# Altium footprint library pcb.PcbLib: 397 footprints (part 6 of 25)
Each footprint in its own frame and in the unit in brackets; x right, y up, seen from the top. Pads: shape width x height; smd on the part's side, far side on the other; paste and mask are expansions set on the pad; w line width, h text height; cw(c..) or ccw(c..) is an arc to the next point about the centre after c.
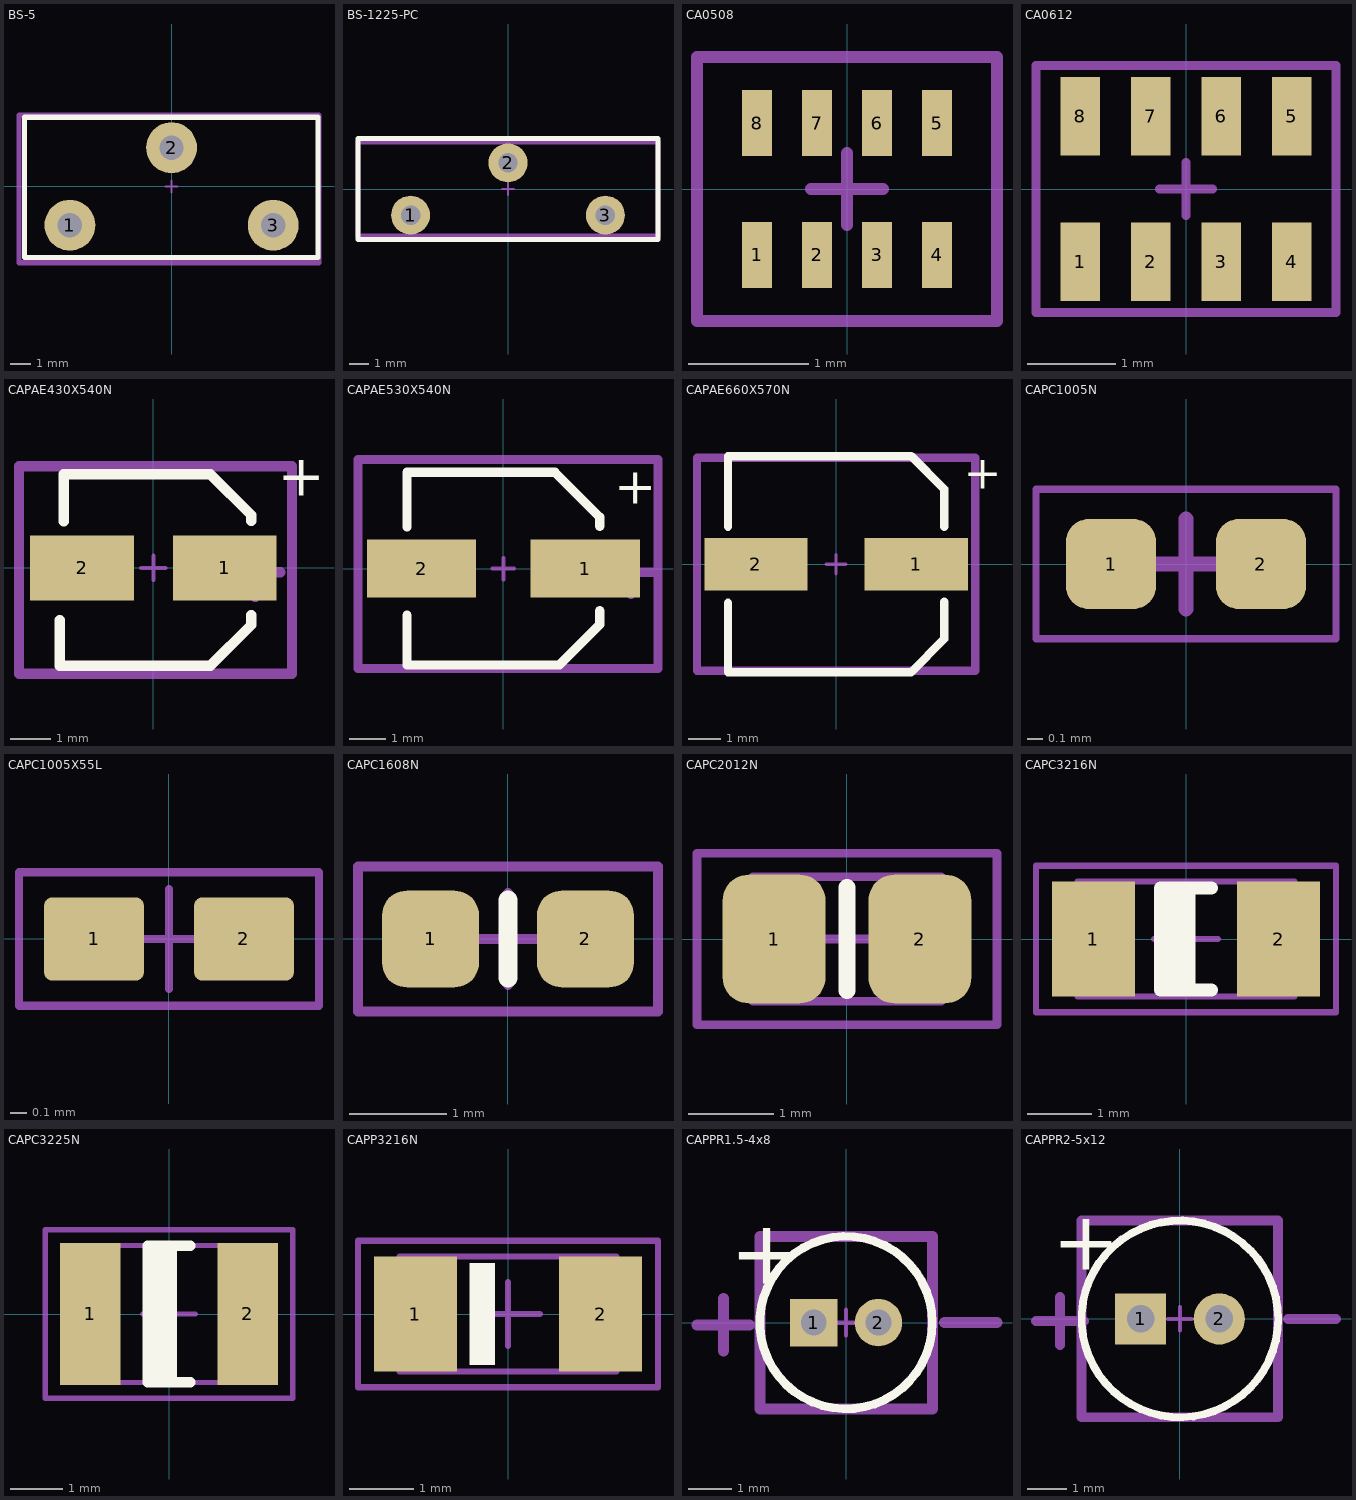
[diagram p5: the footprints below, top view; thin cyan lines are the x and y axes]

## BS-5 [mm] "Holder, Coin Cell CR2032"
height 6.75
pads (3):
  round 2.5 hole 1.2: 1(-5,-1.905) 2(0,1.905) 3(5,-1.905)
Top Overlay:
  lines w0.254: -7.224,-3.5 7.2,-3.5 7.2,3.4 -7.224,3.4 -7.224,-3.5
Mechanical 15:
  lines w0.1: -0.3,0 0.3,0 ; 0,-0.3 0,0.3
  lines w0.254: -7.5,-3.75 -7.5,3.5 7.25,3.5 7.25,-3.75 -7.5,-3.75
  text ".Designator" at -4.5,-0.5 h1.02
3D body: height 24.48, standoff 1.52, extent -11.555,-3 11.355,2.8
3D body: height 5, standoff 0, extent -7,-3 7,2.8

## BS-1225-PC [mm] "Holder, Coin Cell CR1220"
height 6.75
pads (3):
  round 2 hole 1: 1(-5,-1.345) 2(0,1.345) 3(5,-1.345)
Top Overlay:
  lines w0.254: -7.7,-2.6 7.7,-2.6 7.7,2.6 -7.7,2.6 -7.7,-2.6
Mechanical 15:
  lines w0.1: -0.3,0 0.3,0 ; 0,-0.3 0,0.3
  lines w0.254: -7.7,-2.4 -7.7,2.4 7.7,2.4 7.7,-2.4 -7.7,-2.4
  text ".Designator" at -4.5,-0.5 h1.02
3D body "BS-1225-PC.STEP": height 14.02, standoff -2.79, extent -7.637,-2.3 7.637,2.33
3D body: height 14.24, standoff 1.76, extent -6.025,-1.9 6.425,1.6

## CA0508 [mm]
height 1
pads (8):
  rect 0.25x0.55 smd paste-0.03: 1(-0.75,-0.55) 2(-0.25,-0.55) 3(0.25,-0.55) 4(0.75,-0.55) 5(0.75,0.55) 6(0.25,0.55) 7(-0.25,0.55) 8(-0.75,0.55)
Mechanical 15:
  lines w0.1: -0.3,0 0.3,0 ; 0,-0.3 0,0.3 ; -1.25,-1.1 1.25,-1.1 1.25,1.1 -1.25,1.1 -1.25,-1.1
  text ".Designator" at -0.9,-0.8 h0.51
3D body: height 0.45, standoff 0, extent -1,-0.625 1,0.625

## CA0612 [mm]
height 1
pads (8):
  rect 0.45x0.89 smd paste-0.03: 1(-1.2,-0.825) 2(-0.4,-0.825) 3(0.4,-0.825) 4(1.2,-0.825) 5(1.2,0.825) 6(0.4,0.825) 7(-0.4,0.825) 8(-1.2,0.825)
Mechanical 15:
  lines w0.1: -0.3,0 0.3,0 ; 0,-0.3 0,0.3 ; -1.7,-1.4 -1.7,1.4 1.7,1.4 1.7,-1.4 -1.7,-1.4
  text ".Designator" at -1.5,-1.2 h0.51
3D body: height 0.45, standoff 0, extent -1.6,-0.8 1.6,0.8

## CAPAE430X540N [mm] "Capacitor,Aluminum Electrolytic;4.30mm L X 4.30mm W X 5.40mm H"
height 5.4
pads (2):
  rect 2.55x1.6 smd: 1(1.75,0) 2(-1.75,0)
Top Overlay:
  lines w0.254: -2.3,-1.287 -2.3,-2.4 1.4,-2.4 2.4,-1.4 2.4,-1.16 ; -2.2,1.143 -2.2,2.3 1.4,2.3 2.4,1.3 2.4,1.16
  text "+" at 3.048,1.778 h1.02
Mechanical 15:
  lines w0.1: -0.3,0 0.3,0 ; 0,-0.3 0,0.3
  lines w0.254: -2.7,-0.2 -1.481,-0.2 ; 1.89,-0.102 3.11,-0.102 ; 2.5,-0.711 2.5,0.508 ; -3.3,-2.6 3.4,-2.6 3.4,2.5 -3.3,2.5 -3.3,-2.6
  text ".Designator" at -2.5,-2.1 h1.02
3D body: height 6, standoff 1, extent -2.1,-2.2 2.183,2.092
3D body: height 1, standoff 0, extent -2.1,-2.2 2.2,2.1

## CAPAE530X540N [mm] "Aluminium Electrolytic Capacitor, 5.3x5.3x5.4mm"
height 5.4
pads (2):
  rect 3x1.6 smd: 1(2.25,0) 2(-2.25,0)
Top Overlay:
  lines w0.254: -2.65,-1.287 -2.65,-2.65 1.541,-2.65 2.65,-1.541 2.65,-1.16 ; -2.65,1.143 -2.65,2.65 1.414,2.65 2.65,1.414 2.65,1.16
  text "+" at 3.048,1.778 h1.02
Mechanical 15:
  lines w0.1: -0.3,0 0.3,0 ; 0,-0.3 0,0.3
  lines w0.254: -3.607,0 -2.388,0 ; 2.896,-0.102 4.115,-0.102 ; 3.505,-0.711 3.505,0.508 ; -4,-2.75 4.25,-2.75 4.25,3 -4,3 -4,-2.75
  text ".Designator" at -3,-2 h1.02
3D body: height 6, standoff 1, extent -2.679,-2.69 2.6,2.6
3D body: height 1, standoff 0, extent -2.667,-2.667 2.667,2.667

## CAPAE660X570N [mm] "Aluminium Electrolytic Capacitor, 6.6x6.6x5.4mm"
height 5.4
pads (2):
  rect 3.15x1.6 smd: 1(2.45,0) 2(-2.45,0)
Top Overlay:
  lines w0.254: -3.3,-1.175 -3.3,-3.3 2.286,-3.3 3.3,-2.286 3.3,-1.15 ; -3.3,1.143 -3.3,3.3 2.286,3.3 2.3,3.3 3.3,2.3 3.3,1.143
  text "+" at 3.9,2.3 h1.02
Mechanical 15:
  lines w0.1: -0.3,0 0.3,0 ; 0,-0.3 0,0.3
  lines w0.254: -3.81,-0.051 -2.591,-0.051 ; 2.54,-0.051 3.759,-0.051 ; 3.15,-0.66 3.15,0.559 ; -4.25,-3.25 -4.25,3.25 4.25,3.25 4.25,-3.25 -4.25,-3.25
  text ".Designator" at -3.5,-2.25 h1.02
3D body: height 6.9, standoff 1, extent -3.3,-3.293 3.274,3.293
3D body: height 1, standoff 0, extent -3.3,-3.3 3.3,3.3

## CAPC1005N [mm] "Chip Capacitor, Body 1.0x0.5mm, IPC Medium Density"
height 0.6
pads (2):
  rrect50% 0.6x0.6 smd: 1(-0.5,0) 2(0.5,0)
Mechanical 15:
  lines w0.05: -1,-0.5 -1,0.5 1,0.5 1,-0.5 -1,-0.5
  lines w0.1: -0.3,0 0.3,0 ; 0,-0.3 0,0.3
  text ".Designator" at -0.9,-0.4 h0.3
3D body: height 0.5, standoff 0, extent -0.5,-0.25 0.5,0.25

## CAPC1005X55L [mm] "Chip Capacitor, Body 1.0x0.5mm, IPC Medium Density"
height 0.6
pads (2):
  rrect20% 0.6x0.5 smd mask+0.06: 1(-0.45,0) 2(0.45,0)
Mechanical 15:
  lines w0.05: -0.3,0 0.3,0 ; 0,-0.3 0,0.3 ; -0.9,-0.4 -0.9,0.4 0.9,0.4 0.9,-0.4 -0.9,-0.4
  text ".Designator" at -0.8,-0.3 h0.3
3D body: height 0.5, standoff 0, extent -0.5,-0.25 0.5,0.25

## CAPC1608N [mm] "Chip Capacitor, Body 1.6x0.8mm, IPC Medium Density"
height 0.85
pads (2):
  rrect50% 1x1 smd: 1(-0.8,0) 2(0.8,0)
Top Overlay:
  lines w0.2: 0,-0.4 0,0.4
Mechanical 15:
  lines w0.1: -0.475,0 0.475,0 ; 0,-0.475 0,0.475 ; -1.55,-0.75 -1.55,0.75 1.55,0.75 1.55,-0.75 -1.55,-0.75
  text ".Designator" at -1.55,-0.61 h0.51
3D body: height 0.85, standoff 0, extent -0.8,-0.4 0.8,0.4

## CAPC2012N [mm] "Chip Capacitor, Body 2.0x1.3mm, IPC Medium Density"
height 1.1
pads (2):
  rrect50% 1.2x1.5 smd: 1(-0.85,0) 2(0.85,0)
Top Overlay:
  lines w0.2: 0,-0.6 0,0.6
Mechanical 13:
  lines w0.1: -1.1,-0.725 -1.1,0.725 1.1,0.725 1.1,-0.725 -1.1,-0.725
Mechanical 15:
  lines w0.1: -0.5,0 0.5,0 ; 0,-0.5 0,0.5 ; -1.75,-1 -1.75,1 1.75,1 1.75,-1 -1.75,-1
  text ".Designator" at -1.575,-0.864 h0.76
3D body: height 1.1, standoff 0, extent -1.1,-0.725 1.1,0.725

## CAPC3216N [mm] "Chip Capacitor, Body 3.2x1.6mm, IPC Medium Density"
height 1.35
pads (2):
  rect 1.3x1.8 smd: 1(-1.45,0) 2(1.45,0)
Top Overlay:
  rectangle: -0.4,-0.8 0.15,0.8
  lines w0.2: 0.4,-0.8 -0.4,-0.8 -0.4,0.8 0.4,0.8
Mechanical 13:
  lines w0.1: -1.7,-0.9 -1.7,0.9 1.7,0.9 1.7,-0.9 -1.7,-0.9
Mechanical 15:
  lines w0.1: -0.5,0 0.5,0 ; 0,-0.5 0,0.5 ; -2.35,-1.15 -2.35,1.15 2.35,1.15 2.35,-1.15 -2.35,-1.15
  text ".Designator" at -2.083,-0.965 h1.02
3D body: height 1.35, standoff 0, extent -1.7,-0.9 1.7,0.9

## CAPC3225N [mm] "Chip Capacitor, Body 3.2x2.5mm, IPC Medium Density"
height 1.1
pads (2):
  rect 1.15x2.7 smd: 1(-1.5,0) 2(1.5,0)
Top Overlay:
  rectangle: -0.4,-1.3 0.15,1.3
  lines w0.2: 0.4,-1.3 -0.4,-1.3 -0.4,1.3 0.4,1.3
Mechanical 13:
  lines w0.1: -1.7,-1.3 -1.7,1.3 1.7,1.3 1.7,-1.3 -1.7,-1.3
Mechanical 15:
  lines w0.1: -0.5,0 0.5,0 ; 0,-0.5 0,0.5 ; -2.35,-1.6 -2.35,1.6 2.35,1.6 2.35,-1.6 -2.35,-1.6
  text ".Designator" at -2.083,-0.965 h1.02
3D body: height 1.35, standoff 0, extent -1.7,-1.3 1.7,1.3

## CAPP3216N [mm] "Chip Capacitor, Body 3.2x1.6mm, IPC Medium Density"
height 1.6
pads (2):
  rect 1.3x1.8 smd: 1(-1.45,0) 2(1.45,0)
Top Overlay:
  rectangle: -0.6,-0.8 -0.2,0.8
Mechanical 13:
  lines w0.1: -1.7,-0.9 1.7,-0.9 1.7,0.9 -1.7,0.9 -1.7,-0.9
Mechanical 15:
  lines w0.1: -0.5,0 0.5,0 ; 0,-0.5 0,0.5 ; -2.35,-1.15 2.35,-1.15 2.35,1.15 -2.35,1.15 -2.35,-1.15
  text ".Designator" at -2.083,-0.965 h1.02
3D body: height 1.6, standoff 0, extent -1.7,-0.9 1.7,0.9

## CAPPR1.5-4x8 [mm] "Capacitor, Electrolytic, Radial; Body 4 x 8 mm (Dia.xH typ); Pin Spacing 1.5 mm (typ)"
height 8
pads (2):
  rect 1.1x1.1 hole 0.6: 1(-0.75,0)
  round 1.1 hole 0.6: 2(0.75,0)
Top Overlay:
  circle w0.2: c0,0 r2
  text "+" at -2.7,0.9 h1.5
Mechanical 15:
  lines w0.1: -0.3,0 0.3,0 ; 0,-0.3 0,0.3
  lines w0.254: -3.458,-0.051 -2.238,-0.051 ; -2.848,-0.66 -2.848,0.559 ; 2.281,0 3.5,0 ; -2,-2 2,-2 2,2 -2,2 -2,-2
  text ".Designator" at -1.9,2.4 h1.02
3D body: height 8, standoff 0, extent -2.006,-2.004 1.99,1.994

## CAPPR2-5x12 [mm] "Capacitor, Electrolytic, Radial; Body 5 x 12 mm (Dia.xH typ); Pin Spacing 2 mm (typ)"
height 12
pads (2):
  rect 1.3x1.3 hole 0.7: 1(-1,0)
  round 1.3 hole 0.7: 2(1,0)
Top Overlay:
  circle w0.2: c0,0 r2.5
  text "+" at -3.25,1.25 h1.5
Mechanical 15:
  lines w0.1: -0.3,0 0.3,0 ; 0,-0.3 0,0.3
  lines w0.254: -3.658,-0.051 -2.438,-0.051 ; -3.048,-0.66 -3.048,0.559 ; 2.75,0 3.969,0 ; -2.5,-2.5 2.5,-2.5 2.5,2.5 -2.5,2.5 -2.5,-2.5
  text ".Designator" at -2.25,3 h1.02
3D body: height 12, standoff 0, extent -2.49,-2.5 2.49,2.49